# Altium footprint library SYB.PcbLib.PcbLib: 89 footprints (part 2 of 6)
Each footprint in its own frame and in the unit in brackets; x right, y up, seen from the top. Pads: shape width x height; smd on the part's side, far side on the other; paste and mask are expansions set on the pad; w line width, h text height; cw(c..) or ccw(c..) is an arc to the next point about the centre after c.
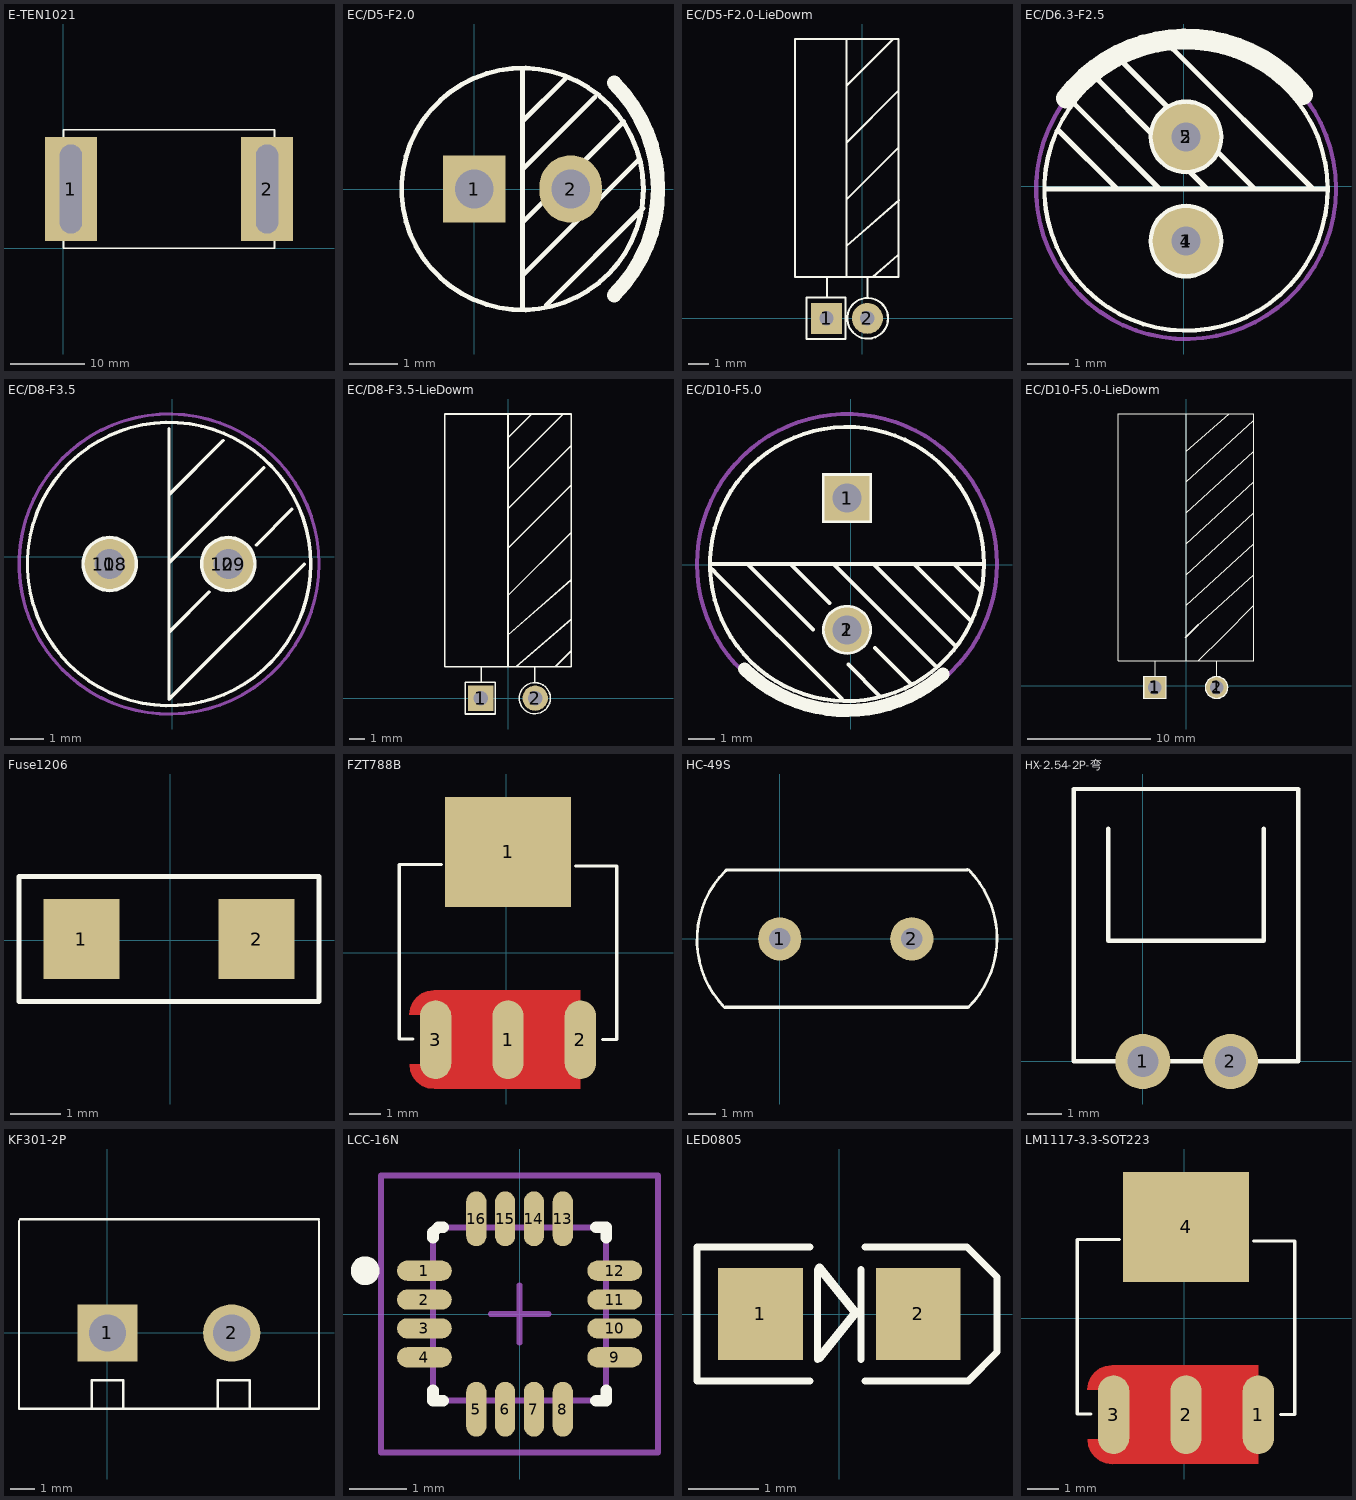
[diagram p1: the footprints below, top view; thin cyan lines are the x and y axes]

## E-TEN1021 [mm]
pads (2):
  rect 7x14 hole 3 slot 12 at 90 deg: 1(1,8) 2(27.5,8)
Top Overlay:
  lines w0.254: 0,0 0,16 28.5,16 28.5,0 0,0

## EC/D5-F2.0 [mm] "EC/D5-F2.0"
pads (2):
  rect 1.3x1.4 hole 0.8: 1(0,0)
  oval 1.3x1.4 hole 0.8: 2(2,0)
Top Overlay:
  circle w0.1: c1,0 r2.508
  lines w0.1: 1,-2.5 1,2.5 ; 1,-1.8 3.4,0.6 ; 1,-0.7 3.1,1.4 ; 1,0.4 2.5,1.9 ; 1,1.4 1.9,2.3 ; 1.5,-2.4 3.5,-0.4 ; 1.684,0.235 1.81,0.222
  lines w0.3: 2.9,-2.2 ccw(c0.7,0) 2.9,2.2
3D body: height 11, standoff 0, extent -1.484,-2.504 3.496,2.486

## EC/D5-F2.0-LieDowm [mm]
pads (2):
  rect 1.5x1.5 hole 0.7: 1(-1.725,0)
  round 1.5 hole 0.7: 2(0.25,0)
Top Overlay:
  circle w0.1: c0.265,0 r0.985
  lines w0.1: -1.7,1 -1.7,2 ; -0.75,2 -0.75,13.5 ; -0.75,3.5 1.781,5.715 ; -0.75,5.75 1.75,8.25 ; -0.75,8.5 1.75,11 ; -0.75,11.25 1.5,13.5 ; 0.25,1 0.25,2 ; 0.5,2 1.715,3.041 ; -3.25,2 -3.25,9.25 -3.25,13.5 1.75,13.5 1.75,2 -3.25,2 ; -2.7,-1 -0.8,-1 -0.8,1 -2.7,1 -2.7,-1

## EC/D6.3-F2.5 [mm] "EC/D6.3-F2.5"
height 12
pads (4):
  round 1.6 hole 0.7: 1(0.057,-1.312) 2(0.057,1.188)
  round 1.8 on Top Overlay: 4(0.057,-1.312) 5(0.057,1.188)
Top Overlay:
  circle w0.102: c0.057,-0.062 r3.4
  lines w0.127: -3.31,-0.062 3.433,-0.062 ; -3.001,1.345 -1.594,-0.062 ; -2.624,1.984 -0.578,-0.062 ; -2.04,2.547 -0.659,1.162 ; -1.428,2.947 -0.318,1.837 ; -0.266,0.769 0.565,-0.062 ; -0.26,3.303 3.104,-0.061 ; 0.696,0.951 1.706,-0.062
  lines w0.5: -2.809,2.116 cw(c0.057,-0.062) 2.858,2.2
Bottom Overlay:
  text "+" at -1.721,-1.84 h1.5
Mechanical 2:
  circle w0.102: c0.057,-0.062 r3.6
3D body: height 0, standoff -2.5, extent -0.217,-1.862 0.382,-1.265
3D body: height 0, standoff -2.5, extent -0.242,1.213 0.357,1.81
3D body: height 12.5, standoff 0, extent -3.32,-3.435 3.466,3.338

## EC/D8-F3.5 [mm] "EC/D8-F3.5"
pads (4):
  round 1.5 / inner round 1.5 / far side round 1.9 hole 0.9: 1(-1.877,-0.211) 2(1.679,-0.211)
  round 1.7 on Top Overlay: 108(-1.877,-0.211) 109(1.679,-0.211)
Top Overlay:
  circle w0.102: c-0.099,-0.211 r4.25
  lines w0.102: -0.099,-2.255 1.107,-1.05 ; -0.099,-0.173 2.748,2.674 ; -0.099,1.862 1.536,3.496 ; -0.099,3.853 -0.099,-4.275 3.961,-0.216 ; 2.515,0.358 3.589,1.432
Mechanical 2:
  circle w0.102: c-0.099,-0.211 r4.5
3D body: height 12, standoff 0.01, extent -4.074,-4.186 3.895,3.798
3D body: height 0, standoff -3, extent -2.189,-0.51 -1.59,0.088
3D body: height 0, standoff -3, extent 1.381,-0.51 1.98,0.088
3D body: height 0.01, standoff 0, extent -2.777,-2.891 2.601,2.499
3D body: height 12.01, standoff 12, extent -2.777,-2.891 2.601,2.499
3D body: height 12.01, standoff 12, extent 2.306,-1.99 3.911,1.567
3D body: height 12, standoff 0, extent 3.495,-1.991 3.913,1.568
3D body: height 0.01, standoff 0, extent 2.306,-1.99 3.911,1.567

## EC/D8-F3.5-LieDowm [mm]
pads (2):
  rect 1.6x1.6 hole 0.9: 1(-1.725,0)
  round 1.6 hole 0.9: 2(1.725,0)
Top Overlay:
  circle w0.1: c1.7,0 r0.985
  lines w0.1: -1.7,1 -1.7,2 ; 0,2 0,18 ; 0,4 4,7.5 ; 0,6.5 4,10.5 ; 0,9.5 4,13.5 ; 0,12 4,16 ; 0,14.5 3.5,18 ; 0,16.5 1.5,18 ; 0.5,2 4,5 ; 1.7,1 1.7,2 ; 3,2 4,3 ; -4,2 -4,10 -4,18 4,18 4,2 -4,2 ; -2.7,-1 -0.8,-1 -0.8,1 -2.7,1 -2.7,-1

## EC/D10-F5.0 [mm] "470μF-10V-机插-10间距"
pads (4):
  round 1.9 on Top Overlay: 1(-0.146,-2.475)
  rect 1.9x1.9 on Top Overlay: 1(-0.146,2.525)
  rect 1.7x1.7 hole 1.1: 1(-0.146,2.525)
  round 1.7 hole 1.1: 2(-0.146,-2.475)
Top Overlay:
  circle w0.152: c-0.146,0.025 r5.207
  lines w0.152: -5.352,0.025 -5.226,0.025 -2.178,0.025 4.934,0.025 5.057,0.025 ; -5.344,-0.111 -5.226,-0.229 -5.099,-0.356 -0.4,-5.055 -0.277,-5.178 ; -3.92,0.025 -1.439,-2.455 ; -2.438,0.025 -2.287,0.025 -0.813,-1.448 ; -0.654,0.025 3.156,-3.785 3.267,-3.895 ; -0.094,-3.8 1.115,-5.009 ; 0.87,0.025 3.791,-2.896 4.002,-3.106 ; 0.913,-3.174 2.301,-4.562 ; 2.394,0.025 4.426,-2.007 4.577,-2.158 ; 3.918,0.025 4.807,-0.864 4.937,-0.993
  lines w0.5: -4.041,-3.965 ccw(c-0.162,0.016) 3.503,-4.164
Bottom Overlay:
  region: -1.233,-2.492 -1.198,-2.76 -1.095,-3.009 -0.93,-3.223 -0.924,-3.217 -0.894,-3.259 -0.68,-3.423 -0.431,-3.527 -0.163,-3.562 -0.163,-3.553 -1.206,-4.604 -1.452,-4.572 -1.68,-4.477 -1.876,-4.327 -1.87,-4.321 -2.04,-4.162 -2.177,-3.983 -2.263,-3.776 -2.292,-3.553 -2.285,-3.553
  region: 0.941,2.543 0.906,2.81 0.803,3.06 0.639,3.274 0.633,3.267 0.602,3.31 0.388,3.474 0.139,3.577 -0.128,3.613 -0.128,3.604 0.915,4.655 1.16,4.623 1.388,4.528 1.584,4.377 1.579,4.372 1.748,4.212 1.885,4.034 1.971,3.827 2.001,3.604 1.993,3.604
Mechanical 2:
  circle w0.152: c-0.146,0.025 r5.7
3D body: height 0.01, standoff 0, extent -3.642,-3.445 3.344,3.528
3D body: height 0.01, standoff 0, extent -2.236,-4.985 1.928,-3.145
3D body: height 12, standoff 0.01, extent -5.136,-4.955 4.844,5.005
3D body: height 0, standoff -3, extent -0.494,-2.865 0.203,-2.166
3D body: height 0, standoff -3, extent -0.495,2.265 0.204,2.963
3D body: height 12.01, standoff 12, extent -3.642,-3.445 3.344,3.528
3D body: height 12, standoff 0, extent -2.238,-4.987 1.942,-4.515
3D body: height 12.01, standoff 12, extent -2.236,-4.985 1.928,-3.145

## EC/D10-F5.0-LieDowm [mm]
pads (4):
  rect 1.9x1.9 on Top Overlay: 1(-2.525,-0.146)
  rect 1.7x1.7 hole 1.1: 1(-2.525,-0.146)
  round 1.9 on Top Overlay: 1(2.475,-0.146)
  round 1.7 hole 1.1: 2(2.475,-0.146)
Top Overlay:
  lines w0.1: -2.5,0.5 -2.5,2 ; 0,2 0,4.5 0,22 ; 0,6.5 5.5,11.5 ; 0,9 5.5,14 ; 0,11.5 5.5,16.5 ; 0,14 5.5,19 ; 0,16.5 5.5,21.5 ; 0,19 3.5,22 ; 0.5,4.5 5.5,9 5.5,2 -5.5,2 -5.5,12 -5.5,22 5.5,22 5.5,8.5 ; 1,2 3,4 5.5,6.5 ; 2.5,0.5 2.5,2
  lines w0.152: -0.025,3.918 0.864,4.807 0.993,4.937
Bottom Overlay:
  region: 2.492,-1.233 2.76,-1.198 3.009,-1.095 3.223,-0.93 3.217,-0.924 3.259,-0.894 3.423,-0.68 3.527,-0.431 3.562,-0.163 3.553,-0.163 4.604,-1.206 4.572,-1.452 4.477,-1.68 4.327,-1.876 4.321,-1.87 4.162,-2.04 3.983,-2.177 3.776,-2.263 3.553,-2.292 3.553,-2.285
  region: -2.543,0.941 -2.81,0.906 -3.06,0.803 -3.274,0.639 -3.267,0.633 -3.31,0.602 -3.474,0.388 -3.577,0.139 -3.613,-0.128 -3.604,-0.128 -4.655,0.915 -4.623,1.16 -4.528,1.388 -4.377,1.584 -4.372,1.579 -4.212,1.748 -4.034,1.885 -3.827,1.971 -3.604,2.001 -3.604,1.993
3D body: height 0, standoff -3, extent 2.166,-0.494 2.865,0.203
3D body: height 0, standoff -3, extent -2.963,-0.495 -2.265,0.204

## Fuse1206 [mm]
pads (2):
  rect 1.52x1.6 smd: 1(-1.775,0.025) 2(1.725,0.025)
Top Overlay:
  lines w0.1: -3.025,-1.225 2.975,-1.225 2.975,1.275 -3.025,1.275 -3.025,-1.225
3D body: height 0.56, standoff 0, extent -1.651,-0.802 1.551,0.85

## FZT788B [mm]
pads (4):
  oval 1x2.5 smd: 1(0.051,-2.755) 2(2.351,-2.755) 3(-2.249,-2.755)
  rect 4x3.5 smd: 1(0.051,3.202)
Top Layer:
  pour cut-out: 2.351,-1.193 2.351,-4.317 -2.294,-4.323 -2.496,-4.297 -2.683,-4.219 -2.845,-4.095 -2.968,-3.934 -3.046,-3.746 -3.072,-3.545 -3.066,-3.545 -2.248,-3.545 -2.248,-1.961 -3.08,-1.961 -3.054,-1.76 -2.976,-1.574 -2.853,-1.413 -2.693,-1.29 -2.506,-1.213 -2.306,-1.186 -2.306,-1.193
Top Overlay:
  lines w0.102: -2.968,-2.736 -3.399,-2.736 -3.399,2.808 -2.071,2.808 ; 2.196,2.757 3.48,2.757 ; 3.055,-2.751 3.48,-2.751 ; 3.501,-2.751 3.501,2.757
3D body: height 1.7, standoff 0.1, extent -3.299,-1.705 3.401,1.845
3D body: height 0.35, standoff 0, extent -2.649,-3.305 -1.849,-2.405
3D body: height 1.02, standoff 0.67, extent -2.649,-2.755 -1.849,-1.705
3D body: height 0.67, standoff 0.35, extent -2.649,-2.755 -1.849,-2.405
3D body: height 0.67, standoff 0.35, extent -1.499,2.395 1.601,2.745
3D body: height 1.02, standoff 0.67, extent -1.499,1.845 1.601,2.745
3D body: height 0.35, standoff 0, extent -1.499,2.395 1.601,3.395
3D body: height 0.67, standoff 0.35, extent -0.349,-2.755 0.451,-2.405
3D body: height 1.02, standoff 0.67, extent -0.349,-2.755 0.451,-1.705
3D body: height 0.35, standoff 0, extent -0.349,-3.305 0.451,-2.405
3D body: height 0.67, standoff 0.35, extent 1.951,-2.755 2.751,-2.405
3D body: height 1.02, standoff 0.67, extent 1.951,-2.755 2.751,-1.705
3D body: height 0.35, standoff 0, extent 1.951,-3.305 2.751,-2.405

## HC-49S [mm] "无源晶振20M"
pads (2):
  round 1.6 hole 0.8: 1(0,0) 2(4.88,0)
Top Overlay:
  lines w0.1: -2.035,-2.535 cw(c0.535,-0.025) -2.005,2.515 ; 6.975,-2.525 ccw(c4.435,0.015) 6.975,2.555
  lines w0.127: -2,-2.525 6.95,-2.525 ; -1.975,2.54 6.925,2.55
3D body: height 3.6, standoff -3, extent -3.025,-2.25 7.955,2.241

## HX-2.54-2P-弯 [mm] "防呆插座2.54MM-2P-弯脚"
pads (2):
  round 1.6 hole 0.9: 1(0,0) 2(2.54,0)
Top Overlay:
  lines w0.127: -1,6.75 -1,3.5 3.5,3.5 3.5,6.75 ; -2,0 0,0 2.5,0 4.5,0 4.5,7.9 -2,7.9 -2,0
3D body: height 1, standoff 0, extent -2,0 4.5,7.9
3D body: height 3, standoff 0, extent -0.559,-0.508 0.559,0.559
3D body: height 3, standoff 0, extent 1.981,-0.508 3.099,0.559
3D body: height 3, standoff 2, extent -0.483,-0.025 0.432,6.706
3D body: height 3, standoff 2, extent 2.108,-0.025 3.023,6.706
3D body: height 4.7, standoff 4, extent -2,0.051 4.42,7.9

## KF301-2P [mm] "5.0脚距接插件"
height 10
pads (2):
  rect 2.4x2.3 hole 1.5: 1(0,0)
  round 2.3 hole 1.5: 2(5,0)
Top Overlay:
  lines w0.1: -3.556,0 -3.556,4.5 ; -3.556,0.052 -3.556,-3.048 8.509,-3.048 8.509,0.052 ; -3.5,4.572 0,4.572 8.5,4.572 ; -0.635,-3.048 -0.635,-1.905 0.635,-1.905 0.635,-3.048 ; 4.445,-3.048 4.445,-1.905 5.715,-1.905 5.715,-3.048 ; 8.509,0 8.509,4.5

## LCC-16N [mm] "LCC, 16-Pins, Body 3.0x3.0mm (max), Pitch 0.50mm, IPC Medium Density"
height 0.9
pads (16):
  oval 0.95x0.35 smd: 1(-1.65,0.75) 2(-1.65,0.25) 3(-1.65,-0.25) 4(-1.65,-0.75) 9(1.65,-0.75) 10(1.65,-0.25) 11(1.65,0.25) 12(1.65,0.75)
  oval 0.35x0.95 smd: 5(-0.75,-1.65) 6(-0.25,-1.65) 7(0.25,-1.65) 8(0.75,-1.65) 13(0.75,1.65) 14(0.25,1.65) 15(-0.25,1.65) 16(-0.75,1.65)
Top Overlay:
  circle w0.25: c-2.675,0.75 r0.125
  lines w0.2: -1.5,-1.325 -1.5,-1.5 -1.325,-1.5 ; -1.5,1.325 -1.5,1.412 -1.412,1.5 -1.325,1.5 ; 1.325,-1.5 1.5,-1.5 1.5,-1.325 ; 1.325,1.5 1.5,1.5 1.5,1.325
Mechanical 13:
  lines w0.1: -1.5,-1.5 -1.5,1.412 -1.412,1.5 1.5,1.5 1.5,-1.5 -1.5,-1.5
Mechanical 15:
  lines w0.1: -0.5,0 0.5,0 ; 0,-0.5 0,0.5 ; -2.4,-2.4 -2.4,2.4 2.4,2.4 2.4,-2.4 -2.4,-2.4
3D body: height 0.9, standoff 0, extent -1.5,-1.5 1.5,1.5

## LED0805 [mm] "规格2.0x1.2x1.1mm"
height 1.1
pads (2):
  rect 1.2x1.3 smd: 1(-1.118,0.007) 2(1.118,0.007)
Top Overlay:
  lines w0.1: -2.018,0.957 -2.018,-0.943 -0.414,-0.943 ; -2.01,0.957 -0.414,0.957 ; -0.306,-0.635 -0.306,0.635 ; 0.305,-0.635 0.305,0.635 ; 0.364,-0.943 1.825,-0.943 ; 0.364,0.957 1.812,0.957 2.235,0.533 ; 1.829,-0.94 2.235,-0.533 ; 2.235,-0.528 2.235,0.508
  lines w0.127: -0.279,-0.61 0.229,0.025 -0.279,0.66
3D body: height 1.1, standoff 0, extent -0.995,-0.625 1.025,0.625

## LM1117-3.3-SOT223 [mm]
pads (4):
  oval 1x2.5 smd: 1(2.351,-3.055) 2(0.051,-3.055) 3(-2.249,-3.055)
  rect 4x3.5 smd: 4(0.051,2.902)
Top Layer:
  pour cut-out: 2.351,-1.493 2.351,-4.617 -2.294,-4.623 -2.496,-4.597 -2.683,-4.519 -2.845,-4.395 -2.968,-4.234 -3.046,-4.046 -3.072,-3.845 -3.066,-3.845 -2.248,-3.845 -2.248,-2.261 -3.08,-2.261 -3.054,-2.06 -2.976,-1.874 -2.853,-1.713 -2.693,-1.59 -2.506,-1.513 -2.306,-1.486 -2.306,-1.493
Top Overlay:
  lines w0.102: -2.968,-3.036 -3.399,-3.036 -3.399,2.508 -2.071,2.508 ; 2.196,2.457 3.48,2.457 ; 3.055,-3.051 3.48,-3.051 ; 3.501,-3.051 3.501,2.457
3D body: height 0.35, standoff 0, extent 1.951,-3.605 2.751,-2.705
3D body: height 1.02, standoff 0.67, extent 1.951,-3.055 2.751,-2.005
3D body: height 0.67, standoff 0.35, extent 1.951,-3.055 2.751,-2.705
3D body: height 0.35, standoff 0, extent -0.349,-3.605 0.451,-2.705
3D body: height 1.02, standoff 0.67, extent -0.349,-3.055 0.451,-2.005
3D body: height 0.67, standoff 0.35, extent -0.349,-3.055 0.451,-2.705
3D body: height 0.35, standoff 0, extent -1.499,2.095 1.601,3.095
3D body: height 1.02, standoff 0.67, extent -1.499,1.545 1.601,2.445
3D body: height 0.67, standoff 0.35, extent -1.499,2.095 1.601,2.445
3D body: height 0.67, standoff 0.35, extent -2.649,-3.055 -1.849,-2.705
3D body: height 1.02, standoff 0.67, extent -2.649,-3.055 -1.849,-2.005
3D body: height 0.35, standoff 0, extent -2.649,-3.605 -1.849,-2.705
3D body: height 1.7, standoff 0.1, extent -3.299,-2.005 3.401,1.545